# Altium schematic symbol library jlcpcb_2025_04_resistors_extended_2512.schlib: 2667 symbols (part 7 of 14) (continued)
## FRC2512F0000TS
designator R?  Resistance: 0Ω  (hidden comment: *)
Resistor, 0Ω, ±1%, 1W, 200V, -55℃~+155℃, SMD 2512; Manufacturer: Uniroyal; Manufacturer Part Number: FRC2512F0000TS; Supplier 1: LCSC; Supplier Part Number 1: C2934043; JLCPCB Part Number: C2934043; Power Rating: 1W; Category: Resistors; Package Size: 2512; JLCPCB Basic Part: Yes; Tolerance: ±1%; Voltage Rating: 200V; Temperature Rating: -55℃~+155℃; ComponentLink1Description: Datasheet; ComponentLink1URL: https://wmsc.lcsc.com/wmsc/upload/file/pdf/v2/lcsc/2308241947_FOJAN-FRC2512F0000TS_C2934043.pdf; ComponentLink2Description: JLCPCB Part URL; ComponentLink2URL: https://jlcpcb.com/partdetail/C2934043
pins: 1, 2
1 alternate drawing of the same symbol

## FRC2512F1R00TS
designator R?  Resistance: 1Ω  (hidden comment: *)
Resistor, 1Ω, ±1%, 1W, 200V, ±200ppm/℃, SMD 2512; Manufacturer: Uniroyal; Manufacturer Part Number: FRC2512F1R00TS; Supplier 1: LCSC; Supplier Part Number 1: C2999526; JLCPCB Part Number: C2999526; Power Rating: 1W; Category: Resistors; Package Size: 2512; JLCPCB Basic Part: Yes; Tolerance: ±1%; Voltage Rating: 200V; Temperature Coefficient: ±200ppm/℃; ComponentLink1Description: Datasheet; ComponentLink1URL: https://wmsc.lcsc.com/wmsc/upload/file/pdf/v2/lcsc/2308241947_FOJAN-FRC2512F1R00TS_C2999526.pdf; ComponentLink2Description: JLCPCB Part URL; ComponentLink2URL: https://jlcpcb.com/partdetail/C2999526
pins: 1, 2
1 alternate drawing of the same symbol

## FRC2512F1R10TS
designator R?  Resistance: 1.1Ω  (hidden comment: *)
Resistor, 1.1Ω, ±1%, 1W, 200V, ±200ppm/℃, -55℃~+155℃, SMD 2512; Manufacturer: Uniroyal; Manufacturer Part Number: FRC2512F1R10TS; Supplier 1: LCSC; Supplier Part Number 1: C2934053; JLCPCB Part Number: C2934053; Power Rating: 1W; Category: Resistors; Package Size: 2512; JLCPCB Basic Part: Yes; Tolerance: ±1%; Voltage Rating: 200V; Temperature Coefficient: ±200ppm/℃; Temperature Rating: -55℃~+155℃; ComponentLink1Description: Datasheet; ComponentLink1URL: https://wmsc.lcsc.com/wmsc/upload/file/pdf/v2/lcsc/2308241947_FOJAN-FRC2512F1R10TS_C2934053.pdf; ComponentLink2Description: JLCPCB Part URL; ComponentLink2URL: https://jlcpcb.com/partdetail/C2934053
pins: 1, 2
1 alternate drawing of the same symbol

## FRC2512F1R20TS
designator R?  Resistance: 1.2Ω  (hidden comment: *)
Resistor, 1.2Ω, ±1%, 1W, 200V, ±200ppm/℃, -55℃~+155℃, SMD 2512; Manufacturer: Uniroyal; Manufacturer Part Number: FRC2512F1R20TS; Supplier 1: LCSC; Supplier Part Number 1: C2960682; JLCPCB Part Number: C2960682; Power Rating: 1W; Category: Resistors; Package Size: 2512; JLCPCB Basic Part: Yes; Tolerance: ±1%; Voltage Rating: 200V; Temperature Coefficient: ±200ppm/℃; Temperature Rating: -55℃~+155℃; ComponentLink1Description: Datasheet; ComponentLink1URL: https://wmsc.lcsc.com/wmsc/upload/file/pdf/v2/lcsc/2308241947_FOJAN-FRC2512F1R20TS_C2960682.pdf; ComponentLink2Description: JLCPCB Part URL; ComponentLink2URL: https://jlcpcb.com/partdetail/C2960682
pins: 1, 2
1 alternate drawing of the same symbol

## FRC2512F1R50TS
designator R?  Resistance: 1.5Ω  (hidden comment: *)
Resistor, 1.5Ω, ±1%, 1W, 200V, ±200ppm/℃, -55℃~+155℃, SMD 2512; Manufacturer: Uniroyal; Manufacturer Part Number: FRC2512F1R50TS; Supplier 1: LCSC; Supplier Part Number 1: C2934054; JLCPCB Part Number: C2934054; Power Rating: 1W; Category: Resistors; Package Size: 2512; JLCPCB Basic Part: Yes; Tolerance: ±1%; Voltage Rating: 200V; Temperature Coefficient: ±200ppm/℃; Temperature Rating: -55℃~+155℃; ComponentLink1Description: Datasheet; ComponentLink1URL: https://wmsc.lcsc.com/wmsc/upload/file/pdf/v2/lcsc/2308241947_FOJAN-FRC2512F1R50TS_C2934054.pdf; ComponentLink2Description: JLCPCB Part URL; ComponentLink2URL: https://jlcpcb.com/partdetail/C2934054
pins: 1, 2
1 alternate drawing of the same symbol

## FRC2512F1R60TS
designator R?  Resistance: 1.6Ω  (hidden comment: *)
Resistor, 1.6Ω, ±1%, 1W, 200V, ±200ppm/℃, -55℃~+155℃, SMD 2512; Manufacturer: Uniroyal; Manufacturer Part Number: FRC2512F1R60TS; Supplier 1: LCSC; Supplier Part Number 1: C2934055; JLCPCB Part Number: C2934055; Power Rating: 1W; Category: Resistors; Package Size: 2512; JLCPCB Basic Part: Yes; Tolerance: ±1%; Voltage Rating: 200V; Temperature Coefficient: ±200ppm/℃; Temperature Rating: -55℃~+155℃; ComponentLink1Description: Datasheet; ComponentLink1URL: https://wmsc.lcsc.com/wmsc/upload/file/pdf/v2/lcsc/2308241947_FOJAN-FRC2512F1R60TS_C2934055.pdf; ComponentLink2Description: JLCPCB Part URL; ComponentLink2URL: https://jlcpcb.com/partdetail/C2934055
pins: 1, 2
1 alternate drawing of the same symbol

## FRC2512F1R80TS
designator R?  Resistance: 1.8Ω  (hidden comment: *)
Resistor, 1.8Ω, ±1%, 1W, 200V, ±200ppm/℃, -55℃~+155℃, SMD 2512; Manufacturer: Uniroyal; Manufacturer Part Number: FRC2512F1R80TS; Supplier 1: LCSC; Supplier Part Number 1: C2960771; JLCPCB Part Number: C2960771; Power Rating: 1W; Category: Resistors; Package Size: 2512; JLCPCB Basic Part: Yes; Tolerance: ±1%; Voltage Rating: 200V; Temperature Coefficient: ±200ppm/℃; Temperature Rating: -55℃~+155℃; ComponentLink1Description: Datasheet; ComponentLink1URL: https://wmsc.lcsc.com/wmsc/upload/file/pdf/v2/lcsc/2308241947_FOJAN-FRC2512F1R80TS_C2960771.pdf; ComponentLink2Description: JLCPCB Part URL; ComponentLink2URL: https://jlcpcb.com/partdetail/C2960771
pins: 1, 2
1 alternate drawing of the same symbol

## FRC2512F2R20TS
designator R?  Resistance: 2.2Ω  (hidden comment: *)
Resistor, 2.2Ω, ±1%, 1W, 200V, ±200ppm/℃, -55℃~+155℃, SMD 2512; Manufacturer: Uniroyal; Manufacturer Part Number: FRC2512F2R20TS; Supplier 1: LCSC; Supplier Part Number 1: C2934065; JLCPCB Part Number: C2934065; Power Rating: 1W; Category: Resistors; Package Size: 2512; JLCPCB Basic Part: Yes; Tolerance: ±1%; Voltage Rating: 200V; Temperature Coefficient: ±200ppm/℃; Temperature Rating: -55℃~+155℃; ComponentLink1Description: Datasheet; ComponentLink1URL: https://wmsc.lcsc.com/wmsc/upload/file/pdf/v2/lcsc/2202151130_FOJAN-FRC2512F2R20TS_C2934065.pdf; ComponentLink2Description: JLCPCB Part URL; ComponentLink2URL: https://jlcpcb.com/partdetail/C2934065
pins: 1, 2
1 alternate drawing of the same symbol

## FRC2512F2R40TS
designator R?  Resistance: 2.4Ω  (hidden comment: *)
Resistor, 2.4Ω, ±1%, 1W, 200V, ±200ppm/℃, -55℃~+155℃, SMD 2512; Manufacturer: Uniroyal; Manufacturer Part Number: FRC2512F2R40TS; Supplier 1: LCSC; Supplier Part Number 1: C2934066; JLCPCB Part Number: C2934066; Power Rating: 1W; Category: Resistors; Package Size: 2512; JLCPCB Basic Part: Yes; Tolerance: ±1%; Voltage Rating: 200V; Temperature Coefficient: ±200ppm/℃; Temperature Rating: -55℃~+155℃; ComponentLink1Description: Datasheet; ComponentLink1URL: https://wmsc.lcsc.com/wmsc/upload/file/pdf/v2/lcsc/2308241947_FOJAN-FRC2512F2R40TS_C2934066.pdf; ComponentLink2Description: JLCPCB Part URL; ComponentLink2URL: https://jlcpcb.com/partdetail/C2934066
pins: 1, 2
1 alternate drawing of the same symbol

## FRC2512F2R49TS
designator R?  Resistance: 2.49Ω  (hidden comment: *)
Resistor, 2.49Ω, ±1%, 1W, ±200ppm/℃, SMD 2512; Manufacturer: Uniroyal; Manufacturer Part Number: FRC2512F2R49TS; Supplier 1: LCSC; Supplier Part Number 1: C5126187; JLCPCB Part Number: C5126187; Power Rating: 1W; Category: Resistors; Package Size: 2512; JLCPCB Basic Part: Yes; Tolerance: ±1%; Temperature Coefficient: ±200ppm/℃; ComponentLink1Description: Datasheet; ComponentLink1URL: https://wmsc.lcsc.com/wmsc/upload/file/pdf/v2/lcsc/2308241947_FOJAN-FRC2512F2R49TS_C5126187.pdf; ComponentLink2Description: JLCPCB Part URL; ComponentLink2URL: https://jlcpcb.com/partdetail/C5126187
pins: 1, 2
1 alternate drawing of the same symbol

## FRC2512F2R70TS
designator R?  Resistance: 2.7Ω  (hidden comment: *)
Resistor, 2.7Ω, ±1%, 1W, 200V, ±200ppm/℃, SMD 2512; Manufacturer: Uniroyal; Manufacturer Part Number: FRC2512F2R70TS; Supplier 1: LCSC; Supplier Part Number 1: C2999529; JLCPCB Part Number: C2999529; Power Rating: 1W; Category: Resistors; Package Size: 2512; JLCPCB Basic Part: Yes; Tolerance: ±1%; Voltage Rating: 200V; Temperature Coefficient: ±200ppm/℃; ComponentLink1Description: Datasheet; ComponentLink1URL: https://wmsc.lcsc.com/wmsc/upload/file/pdf/v2/lcsc/2308241947_FOJAN-FRC2512F2R70TS_C2999529.pdf; ComponentLink2Description: JLCPCB Part URL; ComponentLink2URL: https://jlcpcb.com/partdetail/C2999529
pins: 1, 2
1 alternate drawing of the same symbol

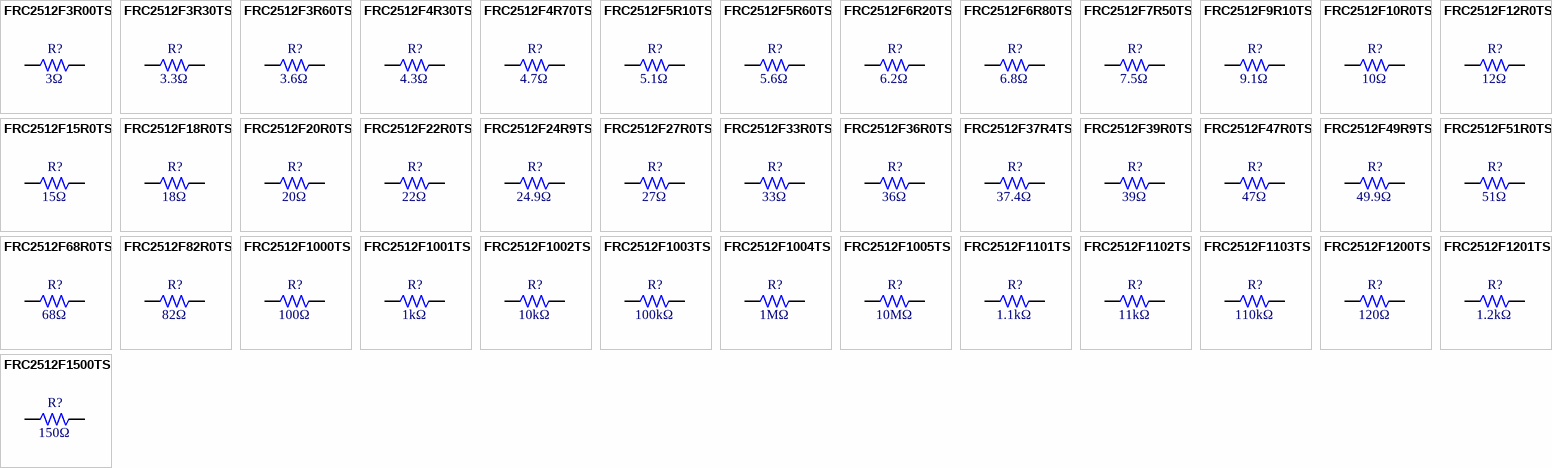
[diagram p31: symbols FRC2512F3R00TS to FRC2512F1500TS]

## FRC2512F3R00TS
designator R?  Resistance: 3Ω  (hidden comment: *)
Resistor, 3Ω, ±1%, 1W, 200V, ±200ppm/℃, SMD 2512; Manufacturer: Uniroyal; Manufacturer Part Number: FRC2512F3R00TS; Supplier 1: LCSC; Supplier Part Number 1: C2999603; JLCPCB Part Number: C2999603; Power Rating: 1W; Category: Resistors; Package Size: 2512; JLCPCB Basic Part: Yes; Tolerance: ±1%; Voltage Rating: 200V; Temperature Coefficient: ±200ppm/℃; ComponentLink1Description: Datasheet; ComponentLink1URL: https://wmsc.lcsc.com/wmsc/upload/file/pdf/v2/lcsc/2308241947_FOJAN-FRC2512F3R00TS_C2999603.pdf; ComponentLink2Description: JLCPCB Part URL; ComponentLink2URL: https://jlcpcb.com/partdetail/C2999603
pins: 1, 2
1 alternate drawing of the same symbol

## FRC2512F3R30TS
designator R?  Resistance: 3.3Ω  (hidden comment: *)
Resistor, 3.3Ω, ±1%, 1W, 200V, ±200ppm/℃, -55℃~+155℃, SMD 2512; Manufacturer: Uniroyal; Manufacturer Part Number: FRC2512F3R30TS; Supplier 1: LCSC; Supplier Part Number 1: C2960811; JLCPCB Part Number: C2960811; Power Rating: 1W; Category: Resistors; Package Size: 2512; JLCPCB Basic Part: Yes; Tolerance: ±1%; Voltage Rating: 200V; Temperature Coefficient: ±200ppm/℃; Temperature Rating: -55℃~+155℃; ComponentLink1Description: Datasheet; ComponentLink1URL: https://wmsc.lcsc.com/wmsc/upload/file/pdf/v2/lcsc/2308241947_FOJAN-FRC2512F3R30TS_C2960811.pdf; ComponentLink2Description: JLCPCB Part URL; ComponentLink2URL: https://jlcpcb.com/partdetail/C2960811
pins: 1, 2
1 alternate drawing of the same symbol

## FRC2512F3R60TS
designator R?  Resistance: 3.6Ω  (hidden comment: *)
Resistor, 3.6Ω, ±1%, 1W, 200V, ±200ppm/℃, -55℃~+155℃, SMD 2512; Manufacturer: Uniroyal; Manufacturer Part Number: FRC2512F3R60TS; Supplier 1: LCSC; Supplier Part Number 1: C2974111; JLCPCB Part Number: C2974111; Power Rating: 1W; Category: Resistors; Package Size: 2512; JLCPCB Basic Part: Yes; Tolerance: ±1%; Voltage Rating: 200V; Temperature Coefficient: ±200ppm/℃; Temperature Rating: -55℃~+155℃; ComponentLink1Description: Datasheet; ComponentLink1URL: https://wmsc.lcsc.com/wmsc/upload/file/pdf/v2/lcsc/2202151130_FOJAN-FRC2512F3R60TS_C2974111.pdf; ComponentLink2Description: JLCPCB Part URL; ComponentLink2URL: https://jlcpcb.com/partdetail/C2974111
pins: 1, 2
1 alternate drawing of the same symbol

## FRC2512F4R30TS
designator R?  Resistance: 4.3Ω  (hidden comment: *)
Resistor, 4.3Ω, ±1%, 1W, 200V, ±200ppm/℃, -55℃~+155℃, SMD 2512; Manufacturer: Uniroyal; Manufacturer Part Number: FRC2512F4R30TS; Supplier 1: LCSC; Supplier Part Number 1: C2960775; JLCPCB Part Number: C2960775; Power Rating: 1W; Category: Resistors; Package Size: 2512; JLCPCB Basic Part: Yes; Tolerance: ±1%; Voltage Rating: 200V; Temperature Coefficient: ±200ppm/℃; Temperature Rating: -55℃~+155℃; ComponentLink1Description: Datasheet; ComponentLink1URL: https://wmsc.lcsc.com/wmsc/upload/file/pdf/v2/lcsc/2308241947_FOJAN-FRC2512F4R30TS_C2960775.pdf; ComponentLink2Description: JLCPCB Part URL; ComponentLink2URL: https://jlcpcb.com/partdetail/C2960775
pins: 1, 2
1 alternate drawing of the same symbol

## FRC2512F4R70TS
designator R?  Resistance: 4.7Ω  (hidden comment: *)
Resistor, 4.7Ω, ±1%, 1W, 200V, ±200ppm/℃, SMD 2512; Manufacturer: Uniroyal; Manufacturer Part Number: FRC2512F4R70TS; Supplier 1: LCSC; Supplier Part Number 1: C2999606; JLCPCB Part Number: C2999606; Power Rating: 1W; Category: Resistors; Package Size: 2512; JLCPCB Basic Part: Yes; Tolerance: ±1%; Voltage Rating: 200V; Temperature Coefficient: ±200ppm/℃; ComponentLink1Description: Datasheet; ComponentLink1URL: https://wmsc.lcsc.com/wmsc/upload/file/pdf/v2/lcsc/2308241947_FOJAN-FRC2512F4R70TS_C2999606.pdf; ComponentLink2Description: JLCPCB Part URL; ComponentLink2URL: https://jlcpcb.com/partdetail/C2999606
pins: 1, 2
1 alternate drawing of the same symbol

## FRC2512F5R10TS
designator R?  Resistance: 5.1Ω  (hidden comment: *)
Resistor, 5.1Ω, ±1%, 1W, 200V, ±200ppm/℃, -55℃~+155℃, SMD 2512; Manufacturer: Uniroyal; Manufacturer Part Number: FRC2512F5R10TS; Supplier 1: LCSC; Supplier Part Number 1: C2934079; JLCPCB Part Number: C2934079; Power Rating: 1W; Category: Resistors; Package Size: 2512; JLCPCB Basic Part: Yes; Tolerance: ±1%; Voltage Rating: 200V; Temperature Coefficient: ±200ppm/℃; Temperature Rating: -55℃~+155℃; ComponentLink1Description: Datasheet; ComponentLink1URL: https://wmsc.lcsc.com/wmsc/upload/file/pdf/v2/lcsc/2308241947_FOJAN-FRC2512F5R10TS_C2934079.pdf; ComponentLink2Description: JLCPCB Part URL; ComponentLink2URL: https://jlcpcb.com/partdetail/C2934079
pins: 1, 2
1 alternate drawing of the same symbol

## FRC2512F5R60TS
designator R?  Resistance: 5.6Ω  (hidden comment: *)
Resistor, 5.6Ω, ±1%, 1W, 200V, ±200ppm/℃, SMD 2512; Manufacturer: Uniroyal; Manufacturer Part Number: FRC2512F5R60TS; Supplier 1: LCSC; Supplier Part Number 1: C2999604; JLCPCB Part Number: C2999604; Power Rating: 1W; Category: Resistors; Package Size: 2512; JLCPCB Basic Part: Yes; Tolerance: ±1%; Voltage Rating: 200V; Temperature Coefficient: ±200ppm/℃; ComponentLink1Description: Datasheet; ComponentLink1URL: https://wmsc.lcsc.com/wmsc/upload/file/pdf/v2/lcsc/2308241947_FOJAN-FRC2512F5R60TS_C2999604.pdf; ComponentLink2Description: JLCPCB Part URL; ComponentLink2URL: https://jlcpcb.com/partdetail/C2999604
pins: 1, 2
1 alternate drawing of the same symbol

## FRC2512F6R20TS
designator R?  Resistance: 6.2Ω  (hidden comment: *)
Resistor, 6.2Ω, ±1%, 1W, 200V, ±200ppm/℃, SMD 2512; Manufacturer: Uniroyal; Manufacturer Part Number: FRC2512F6R20TS; Supplier 1: LCSC; Supplier Part Number 1: C3000561; JLCPCB Part Number: C3000561; Power Rating: 1W; Category: Resistors; Package Size: 2512; JLCPCB Basic Part: Yes; Tolerance: ±1%; Voltage Rating: 200V; Temperature Coefficient: ±200ppm/℃; ComponentLink1Description: Datasheet; ComponentLink1URL: https://wmsc.lcsc.com/wmsc/upload/file/pdf/v2/lcsc/2308241947_FOJAN-FRC2512F6R20TS_C3000561.pdf; ComponentLink2Description: JLCPCB Part URL; ComponentLink2URL: https://jlcpcb.com/partdetail/C3000561
pins: 1, 2
1 alternate drawing of the same symbol

## FRC2512F6R80TS
designator R?  Resistance: 6.8Ω  (hidden comment: *)
Resistor, 6.8Ω, ±1%, 1W, 200V, ±200ppm/℃, SMD 2512; Manufacturer: Uniroyal; Manufacturer Part Number: FRC2512F6R80TS; Supplier 1: LCSC; Supplier Part Number 1: C5121567; JLCPCB Part Number: C5121567; Power Rating: 1W; Category: Resistors; Package Size: 2512; JLCPCB Basic Part: Yes; Tolerance: ±1%; Voltage Rating: 200V; Temperature Coefficient: ±200ppm/℃; ComponentLink1Description: Datasheet; ComponentLink1URL: https://wmsc.lcsc.com/wmsc/upload/file/pdf/v2/lcsc/2308241947_FOJAN-FRC2512F6R80TS_C5121567.pdf; ComponentLink2Description: JLCPCB Part URL; ComponentLink2URL: https://jlcpcb.com/partdetail/C5121567
pins: 1, 2
1 alternate drawing of the same symbol

## FRC2512F7R50TS
designator R?  Resistance: 7.5Ω  (hidden comment: *)
Resistor, 7.5Ω, ±1%, 1W, 200V, ±200ppm/℃, -55℃~+155℃, SMD 2512; Manufacturer: Uniroyal; Manufacturer Part Number: FRC2512F7R50TS; Supplier 1: LCSC; Supplier Part Number 1: C2960814; JLCPCB Part Number: C2960814; Power Rating: 1W; Category: Resistors; Package Size: 2512; JLCPCB Basic Part: Yes; Tolerance: ±1%; Voltage Rating: 200V; Temperature Coefficient: ±200ppm/℃; Temperature Rating: -55℃~+155℃; ComponentLink1Description: Datasheet; ComponentLink1URL: https://wmsc.lcsc.com/wmsc/upload/file/pdf/v2/lcsc/2308241947_FOJAN-FRC2512F7R50TS_C2960814.pdf; ComponentLink2Description: JLCPCB Part URL; ComponentLink2URL: https://jlcpcb.com/partdetail/C2960814
pins: 1, 2
1 alternate drawing of the same symbol

## FRC2512F9R10TS
designator R?  Resistance: 9.1Ω  (hidden comment: *)
Resistor, 9.1Ω, ±1%, 1W, 200V, ±200ppm/℃, SMD 2512; Manufacturer: Uniroyal; Manufacturer Part Number: FRC2512F9R10TS; Supplier 1: LCSC; Supplier Part Number 1: C2999542; JLCPCB Part Number: C2999542; Power Rating: 1W; Category: Resistors; Package Size: 2512; JLCPCB Basic Part: Yes; Tolerance: ±1%; Voltage Rating: 200V; Temperature Coefficient: ±200ppm/℃; ComponentLink1Description: Datasheet; ComponentLink1URL: https://wmsc.lcsc.com/wmsc/upload/file/pdf/v2/lcsc/2308241947_FOJAN-FRC2512F9R10TS_C2999542.pdf; ComponentLink2Description: JLCPCB Part URL; ComponentLink2URL: https://jlcpcb.com/partdetail/C2999542
pins: 1, 2
1 alternate drawing of the same symbol

## FRC2512F10R0TS
designator R?  Resistance: 10Ω  (hidden comment: *)
Resistor, 10Ω, ±1%, 1W, 200V, ±200ppm/℃, -55℃~+155℃, SMD 2512; Manufacturer: Uniroyal; Manufacturer Part Number: FRC2512F10R0TS; Supplier 1: LCSC; Supplier Part Number 1: C2934046; JLCPCB Part Number: C2934046; Power Rating: 1W; Category: Resistors; Package Size: 2512; JLCPCB Basic Part: Yes; Tolerance: ±1%; Voltage Rating: 200V; Temperature Coefficient: ±200ppm/℃; Temperature Rating: -55℃~+155℃; ComponentLink1Description: Datasheet; ComponentLink1URL: https://wmsc.lcsc.com/wmsc/upload/file/pdf/v2/lcsc/2308241947_FOJAN-FRC2512F10R0TS_C2934046.pdf; ComponentLink2Description: JLCPCB Part URL; ComponentLink2URL: https://jlcpcb.com/partdetail/C2934046
pins: 1, 2
1 alternate drawing of the same symbol

## FRC2512F12R0TS
designator R?  Resistance: 12Ω  (hidden comment: *)
Resistor, 12Ω, ±1%, 1W, 200V, ±100ppm/℃, -55℃~+155℃, SMD 2512; Manufacturer: Uniroyal; Manufacturer Part Number: FRC2512F12R0TS; Supplier 1: LCSC; Supplier Part Number 1: C2974108; JLCPCB Part Number: C2974108; Power Rating: 1W; Category: Resistors; Package Size: 2512; JLCPCB Basic Part: Yes; Tolerance: ±1%; Voltage Rating: 200V; Temperature Coefficient: ±100ppm/℃; Temperature Rating: -55℃~+155℃; ComponentLink1Description: Datasheet; ComponentLink1URL: https://wmsc.lcsc.com/wmsc/upload/file/pdf/v2/lcsc/2202151130_FOJAN-FRC2512F12R0TS_C2974108.pdf; ComponentLink2Description: JLCPCB Part URL; ComponentLink2URL: https://jlcpcb.com/partdetail/C2974108
pins: 1, 2
1 alternate drawing of the same symbol

## FRC2512F15R0TS
designator R?  Resistance: 15Ω  (hidden comment: *)
Resistor, 15Ω, ±1%, 1W, 200V, ±100ppm/℃, -55℃~+155℃, SMD 2512; Manufacturer: Uniroyal; Manufacturer Part Number: FRC2512F15R0TS; Supplier 1: LCSC; Supplier Part Number 1: C2934051; JLCPCB Part Number: C2934051; Power Rating: 1W; Category: Resistors; Package Size: 2512; JLCPCB Basic Part: Yes; Tolerance: ±1%; Voltage Rating: 200V; Temperature Coefficient: ±100ppm/℃; Temperature Rating: -55℃~+155℃; ComponentLink1Description: Datasheet; ComponentLink1URL: https://wmsc.lcsc.com/wmsc/upload/file/pdf/v2/lcsc/2308241947_FOJAN-FRC2512F15R0TS_C2934051.pdf; ComponentLink2Description: JLCPCB Part URL; ComponentLink2URL: https://jlcpcb.com/partdetail/C2934051
pins: 1, 2
1 alternate drawing of the same symbol

## FRC2512F18R0TS
designator R?  Resistance: 18Ω  (hidden comment: *)
Resistor, 18Ω, ±1%, 1W, 200V, ±100ppm/℃, -55℃~+155℃, SMD 2512; Manufacturer: Uniroyal; Manufacturer Part Number: FRC2512F18R0TS; Supplier 1: LCSC; Supplier Part Number 1: C2934052; JLCPCB Part Number: C2934052; Power Rating: 1W; Category: Resistors; Package Size: 2512; JLCPCB Basic Part: Yes; Tolerance: ±1%; Voltage Rating: 200V; Temperature Coefficient: ±100ppm/℃; Temperature Rating: -55℃~+155℃; ComponentLink1Description: Datasheet; ComponentLink1URL: https://wmsc.lcsc.com/wmsc/upload/file/pdf/v2/lcsc/2308241947_FOJAN-FRC2512F18R0TS_C2934052.pdf; ComponentLink2Description: JLCPCB Part URL; ComponentLink2URL: https://jlcpcb.com/partdetail/C2934052
pins: 1, 2
1 alternate drawing of the same symbol

## FRC2512F20R0TS
designator R?  Resistance: 20Ω  (hidden comment: *)
Resistor, 20Ω, ±1%, 1W, 200V, ±100ppm/℃, -55℃~+155℃, SMD 2512; Manufacturer: Uniroyal; Manufacturer Part Number: FRC2512F20R0TS; Supplier 1: LCSC; Supplier Part Number 1: C2960725; JLCPCB Part Number: C2960725; Power Rating: 1W; Category: Resistors; Package Size: 2512; JLCPCB Basic Part: Yes; Tolerance: ±1%; Voltage Rating: 200V; Temperature Coefficient: ±100ppm/℃; Temperature Rating: -55℃~+155℃; ComponentLink1Description: Datasheet; ComponentLink1URL: https://wmsc.lcsc.com/wmsc/upload/file/pdf/v2/lcsc/2308241947_FOJAN-FRC2512F20R0TS_C2960725.pdf; ComponentLink2Description: JLCPCB Part URL; ComponentLink2URL: https://jlcpcb.com/partdetail/C2960725
pins: 1, 2
1 alternate drawing of the same symbol

## FRC2512F22R0TS
designator R?  Resistance: 22Ω  (hidden comment: *)
Resistor, 22Ω, ±1%, 1W, 200V, ±100ppm/℃, SMD 2512; Manufacturer: Uniroyal; Manufacturer Part Number: FRC2512F22R0TS; Supplier 1: LCSC; Supplier Part Number 1: C2999530; JLCPCB Part Number: C2999530; Power Rating: 1W; Category: Resistors; Package Size: 2512; JLCPCB Basic Part: Yes; Tolerance: ±1%; Voltage Rating: 200V; Temperature Coefficient: ±100ppm/℃; ComponentLink1Description: Datasheet; ComponentLink1URL: https://wmsc.lcsc.com/wmsc/upload/file/pdf/v2/lcsc/2308241947_FOJAN-FRC2512F22R0TS_C2999530.pdf; ComponentLink2Description: JLCPCB Part URL; ComponentLink2URL: https://jlcpcb.com/partdetail/C2999530
pins: 1, 2
1 alternate drawing of the same symbol

## FRC2512F24R9TS
designator R?  Resistance: 24.9Ω  (hidden comment: *)
Resistor, 24.9Ω, ±1%, 1W, 200V, ±100ppm/℃, -55℃~+155℃, SMD 2512; Manufacturer: Uniroyal; Manufacturer Part Number: FRC2512F24R9TS; Supplier 1: LCSC; Supplier Part Number 1: C2934062; JLCPCB Part Number: C2934062; Power Rating: 1W; Category: Resistors; Package Size: 2512; JLCPCB Basic Part: Yes; Tolerance: ±1%; Voltage Rating: 200V; Temperature Coefficient: ±100ppm/℃; Temperature Rating: -55℃~+155℃; ComponentLink1Description: Datasheet; ComponentLink1URL: https://wmsc.lcsc.com/wmsc/upload/file/pdf/v2/lcsc/2308241947_FOJAN-FRC2512F24R9TS_C2934062.pdf; ComponentLink2Description: JLCPCB Part URL; ComponentLink2URL: https://jlcpcb.com/partdetail/C2934062
pins: 1, 2
1 alternate drawing of the same symbol

## FRC2512F27R0TS
designator R?  Resistance: 27Ω  (hidden comment: *)
Resistor, 27Ω, ±1%, 1W, 200V, ±100ppm/℃, -55℃~+155℃, SMD 2512; Manufacturer: Uniroyal; Manufacturer Part Number: FRC2512F27R0TS; Supplier 1: LCSC; Supplier Part Number 1: C2934064; JLCPCB Part Number: C2934064; Power Rating: 1W; Category: Resistors; Package Size: 2512; JLCPCB Basic Part: Yes; Tolerance: ±1%; Voltage Rating: 200V; Temperature Coefficient: ±100ppm/℃; Temperature Rating: -55℃~+155℃; ComponentLink1Description: Datasheet; ComponentLink1URL: https://wmsc.lcsc.com/wmsc/upload/file/pdf/v2/lcsc/2308241947_FOJAN-FRC2512F27R0TS_C2934064.pdf; ComponentLink2Description: JLCPCB Part URL; ComponentLink2URL: https://jlcpcb.com/partdetail/C2934064
pins: 1, 2
1 alternate drawing of the same symbol

## FRC2512F33R0TS
designator R?  Resistance: 33Ω  (hidden comment: *)
Resistor, 33Ω, ±1%, 1W, 200V, ±100ppm/℃, -55℃~+155℃, SMD 2512; Manufacturer: Uniroyal; Manufacturer Part Number: FRC2512F33R0TS; Supplier 1: LCSC; Supplier Part Number 1: C2934070; JLCPCB Part Number: C2934070; Power Rating: 1W; Category: Resistors; Package Size: 2512; JLCPCB Basic Part: Yes; Tolerance: ±1%; Voltage Rating: 200V; Temperature Coefficient: ±100ppm/℃; Temperature Rating: -55℃~+155℃; ComponentLink1Description: Datasheet; ComponentLink1URL: https://wmsc.lcsc.com/wmsc/upload/file/pdf/v2/lcsc/2308241947_FOJAN-FRC2512F33R0TS_C2934070.pdf; ComponentLink2Description: JLCPCB Part URL; ComponentLink2URL: https://jlcpcb.com/partdetail/C2934070
pins: 1, 2
1 alternate drawing of the same symbol

## FRC2512F36R0TS
designator R?  Resistance: 36Ω  (hidden comment: *)
Resistor, 36Ω, ±1%, 1W, 200V, ±100ppm/℃, SMD 2512; Manufacturer: Uniroyal; Manufacturer Part Number: FRC2512F36R0TS; Supplier 1: LCSC; Supplier Part Number 1: C3013322; JLCPCB Part Number: C3013322; Power Rating: 1W; Category: Resistors; Package Size: 2512; JLCPCB Basic Part: Yes; Tolerance: ±1%; Voltage Rating: 200V; Temperature Coefficient: ±100ppm/℃; ComponentLink1Description: Datasheet; ComponentLink1URL: https://wmsc.lcsc.com/wmsc/upload/file/pdf/v2/lcsc/2308241947_FOJAN-FRC2512F36R0TS_C3013322.pdf; ComponentLink2Description: JLCPCB Part URL; ComponentLink2URL: https://jlcpcb.com/partdetail/C3013322
pins: 1, 2
1 alternate drawing of the same symbol

## FRC2512F37R4TS
designator R?  Resistance: 37.4Ω  (hidden comment: *)
Resistor, 37.4Ω, ±1%, 1W, SMD 2512; Manufacturer: Uniroyal; Manufacturer Part Number: FRC2512F37R4TS; Supplier 1: LCSC; Supplier Part Number 1: C5126023; JLCPCB Part Number: C5126023; Power Rating: 1W; Category: Resistors; Package Size: 2512; JLCPCB Basic Part: Yes; Tolerance: ±1%; ComponentLink1Description: Datasheet; ComponentLink1URL: https://wmsc.lcsc.com/wmsc/upload/file/pdf/v2/lcsc/2308241947_FOJAN-FRC2512F37R4TS_C5126023.pdf; ComponentLink2Description: JLCPCB Part URL; ComponentLink2URL: https://jlcpcb.com/partdetail/C5126023
pins: 1, 2
1 alternate drawing of the same symbol

## FRC2512F39R0TS
designator R?  Resistance: 39Ω  (hidden comment: *)
Resistor, 39Ω, ±1%, 1W, 200V, ±100ppm/℃, -55℃~+155℃, SMD 2512; Manufacturer: Uniroyal; Manufacturer Part Number: FRC2512F39R0TS; Supplier 1: LCSC; Supplier Part Number 1: C2934073; JLCPCB Part Number: C2934073; Power Rating: 1W; Category: Resistors; Package Size: 2512; JLCPCB Basic Part: Yes; Tolerance: ±1%; Voltage Rating: 200V; Temperature Coefficient: ±100ppm/℃; Temperature Rating: -55℃~+155℃; ComponentLink1Description: Datasheet; ComponentLink1URL: https://wmsc.lcsc.com/wmsc/upload/file/pdf/v2/lcsc/2308241947_FOJAN-FRC2512F39R0TS_C2934073.pdf; ComponentLink2Description: JLCPCB Part URL; ComponentLink2URL: https://jlcpcb.com/partdetail/C2934073
pins: 1, 2
1 alternate drawing of the same symbol

## FRC2512F47R0TS
designator R?  Resistance: 47Ω  (hidden comment: *)
Resistor, 47Ω, ±1%, 1W, 200V, ±100ppm/℃, SMD 2512; Manufacturer: Uniroyal; Manufacturer Part Number: FRC2512F47R0TS; Supplier 1: LCSC; Supplier Part Number 1: C3000771; JLCPCB Part Number: C3000771; Power Rating: 1W; Category: Resistors; Package Size: 2512; JLCPCB Basic Part: Yes; Tolerance: ±1%; Voltage Rating: 200V; Temperature Coefficient: ±100ppm/℃; ComponentLink1Description: Datasheet; ComponentLink1URL: https://wmsc.lcsc.com/wmsc/upload/file/pdf/v2/lcsc/2308241947_FOJAN-FRC2512F47R0TS_C3000771.pdf; ComponentLink2Description: JLCPCB Part URL; ComponentLink2URL: https://jlcpcb.com/partdetail/C3000771
pins: 1, 2
1 alternate drawing of the same symbol

## FRC2512F49R9TS
designator R?  Resistance: 49.9Ω  (hidden comment: *)
Resistor, 49.9Ω, ±1%, 1W, 200V, ±100ppm/℃, -55℃~+155℃, SMD 2512; Manufacturer: Uniroyal; Manufacturer Part Number: FRC2512F49R9TS; Supplier 1: LCSC; Supplier Part Number 1: C2960769; JLCPCB Part Number: C2960769; Power Rating: 1W; Category: Resistors; Package Size: 2512; JLCPCB Basic Part: Yes; Tolerance: ±1%; Voltage Rating: 200V; Temperature Coefficient: ±100ppm/℃; Temperature Rating: -55℃~+155℃; ComponentLink1Description: Datasheet; ComponentLink1URL: https://wmsc.lcsc.com/wmsc/upload/file/pdf/v2/lcsc/2308241947_FOJAN-FRC2512F49R9TS_C2960769.pdf; ComponentLink2Description: JLCPCB Part URL; ComponentLink2URL: https://jlcpcb.com/partdetail/C2960769
pins: 1, 2
1 alternate drawing of the same symbol

## FRC2512F51R0TS
designator R?  Resistance: 51Ω  (hidden comment: *)
Resistor, 51Ω, ±1%, 1W, 200V, ±100ppm/℃, -55℃~+155℃, SMD 2512; Manufacturer: Uniroyal; Manufacturer Part Number: FRC2512F51R0TS; Supplier 1: LCSC; Supplier Part Number 1: C2934078; JLCPCB Part Number: C2934078; Power Rating: 1W; Category: Resistors; Package Size: 2512; JLCPCB Basic Part: Yes; Tolerance: ±1%; Voltage Rating: 200V; Temperature Coefficient: ±100ppm/℃; Temperature Rating: -55℃~+155℃; ComponentLink1Description: Datasheet; ComponentLink1URL: https://wmsc.lcsc.com/wmsc/upload/file/pdf/v2/lcsc/2308241947_FOJAN-FRC2512F51R0TS_C2934078.pdf; ComponentLink2Description: JLCPCB Part URL; ComponentLink2URL: https://jlcpcb.com/partdetail/C2934078
pins: 1, 2
1 alternate drawing of the same symbol

## FRC2512F68R0TS
designator R?  Resistance: 68Ω  (hidden comment: *)
Resistor, 68Ω, ±1%, SMD 2512; Manufacturer: Uniroyal; Manufacturer Part Number: FRC2512F68R0TS; Supplier 1: LCSC; Supplier Part Number 1: C2999608; JLCPCB Part Number: C2999608; Category: Resistors; Package Size: 2512; JLCPCB Basic Part: Yes; Tolerance: ±1%; ComponentLink1Description: Datasheet; ComponentLink1URL: https://wmsc.lcsc.com/wmsc/upload/file/pdf/v2/lcsc/2308241947_FOJAN-FRC2512F68R0TS_C2999608.pdf; ComponentLink2Description: JLCPCB Part URL; ComponentLink2URL: https://jlcpcb.com/partdetail/C2999608
pins: 1, 2
1 alternate drawing of the same symbol

## FRC2512F82R0TS
designator R?  Resistance: 82Ω  (hidden comment: *)
Resistor, 82Ω, ±1%, 1W, 200V, ±100ppm/℃, SMD 2512; Manufacturer: Uniroyal; Manufacturer Part Number: FRC2512F82R0TS; Supplier 1: LCSC; Supplier Part Number 1: C3000773; JLCPCB Part Number: C3000773; Power Rating: 1W; Category: Resistors; Package Size: 2512; JLCPCB Basic Part: Yes; Tolerance: ±1%; Voltage Rating: 200V; Temperature Coefficient: ±100ppm/℃; ComponentLink1Description: Datasheet; ComponentLink1URL: https://wmsc.lcsc.com/wmsc/upload/file/pdf/v2/lcsc/2308241947_FOJAN-FRC2512F82R0TS_C3000773.pdf; ComponentLink2Description: JLCPCB Part URL; ComponentLink2URL: https://jlcpcb.com/partdetail/C3000773
pins: 1, 2
1 alternate drawing of the same symbol

## FRC2512F1000TS
designator R?  Resistance: 100Ω  (hidden comment: *)
Resistor, 100Ω, ±1%, 1W, 200V, ±100ppm/℃, -55℃~+155℃, SMD 2512; Manufacturer: Uniroyal; Manufacturer Part Number: FRC2512F1000TS; Supplier 1: LCSC; Supplier Part Number 1: C2960868; JLCPCB Part Number: C2960868; Power Rating: 1W; Category: Resistors; Package Size: 2512; JLCPCB Basic Part: Yes; Tolerance: ±1%; Voltage Rating: 200V; Temperature Coefficient: ±100ppm/℃; Temperature Rating: -55℃~+155℃; ComponentLink1Description: Datasheet; ComponentLink1URL: https://wmsc.lcsc.com/wmsc/upload/file/pdf/v2/lcsc/2308241947_FOJAN-FRC2512F1000TS_C2960868.pdf; ComponentLink2Description: JLCPCB Part URL; ComponentLink2URL: https://jlcpcb.com/partdetail/C2960868
pins: 1, 2
1 alternate drawing of the same symbol

## FRC2512F1001TS
designator R?  Resistance: 1kΩ  (hidden comment: *)
Resistor, 1kΩ, ±1%, 1W, 200V, ±100ppm/℃, -55℃~+155℃, SMD 2512; Manufacturer: Uniroyal; Manufacturer Part Number: FRC2512F1001TS; Supplier 1: LCSC; Supplier Part Number 1: C2960683; JLCPCB Part Number: C2960683; Power Rating: 1W; Category: Resistors; Package Size: 2512; JLCPCB Basic Part: Yes; Tolerance: ±1%; Voltage Rating: 200V; Temperature Coefficient: ±100ppm/℃; Temperature Rating: -55℃~+155℃; ComponentLink1Description: Datasheet; ComponentLink1URL: https://wmsc.lcsc.com/wmsc/upload/file/pdf/v2/lcsc/2308241947_FOJAN-FRC2512F1001TS_C2960683.pdf; ComponentLink2Description: JLCPCB Part URL; ComponentLink2URL: https://jlcpcb.com/partdetail/C2960683
pins: 1, 2
1 alternate drawing of the same symbol

## FRC2512F1002TS
designator R?  Resistance: 10kΩ  (hidden comment: *)
Resistor, 10kΩ, ±1%, 1W, 200V, ±100ppm/℃, -55℃~+155℃, SMD 2512; Manufacturer: Uniroyal; Manufacturer Part Number: FRC2512F1002TS; Supplier 1: LCSC; Supplier Part Number 1: C2934044; JLCPCB Part Number: C2934044; Power Rating: 1W; Category: Resistors; Package Size: 2512; JLCPCB Basic Part: Yes; Tolerance: ±1%; Voltage Rating: 200V; Temperature Coefficient: ±100ppm/℃; Temperature Rating: -55℃~+155℃; ComponentLink1Description: Datasheet; ComponentLink1URL: https://wmsc.lcsc.com/wmsc/upload/file/pdf/v2/lcsc/2308241947_FOJAN-FRC2512F1002TS_C2934044.pdf; ComponentLink2Description: JLCPCB Part URL; ComponentLink2URL: https://jlcpcb.com/partdetail/C2934044
pins: 1, 2
1 alternate drawing of the same symbol

## FRC2512F1003TS
designator R?  Resistance: 100kΩ  (hidden comment: *)
Resistor, 100kΩ, ±1%, 1W, 200V, ±100ppm/℃, -55℃~+155℃, SMD 2512; Manufacturer: Uniroyal; Manufacturer Part Number: FRC2512F1003TS; Supplier 1: LCSC; Supplier Part Number 1: C2934045; JLCPCB Part Number: C2934045; Power Rating: 1W; Category: Resistors; Package Size: 2512; JLCPCB Basic Part: Yes; Tolerance: ±1%; Voltage Rating: 200V; Temperature Coefficient: ±100ppm/℃; Temperature Rating: -55℃~+155℃; ComponentLink1Description: Datasheet; ComponentLink1URL: https://wmsc.lcsc.com/wmsc/upload/file/pdf/v2/lcsc/2308241947_FOJAN-FRC2512F1003TS_C2934045.pdf; ComponentLink2Description: JLCPCB Part URL; ComponentLink2URL: https://jlcpcb.com/partdetail/C2934045
pins: 1, 2
1 alternate drawing of the same symbol

## FRC2512F1004TS
designator R?  Resistance: 1MΩ  (hidden comment: *)
Resistor, 1MΩ, ±1%, 1W, 200V, ±100ppm/℃, SMD 2512; Manufacturer: Uniroyal; Manufacturer Part Number: FRC2512F1004TS; Supplier 1: LCSC; Supplier Part Number 1: C3000673; JLCPCB Part Number: C3000673; Power Rating: 1W; Category: Resistors; Package Size: 2512; JLCPCB Basic Part: Yes; Tolerance: ±1%; Voltage Rating: 200V; Temperature Coefficient: ±100ppm/℃; ComponentLink1Description: Datasheet; ComponentLink1URL: https://wmsc.lcsc.com/wmsc/upload/file/pdf/v2/lcsc/2308241947_FOJAN-FRC2512F1004TS_C3000673.pdf; ComponentLink2Description: JLCPCB Part URL; ComponentLink2URL: https://jlcpcb.com/partdetail/C3000673
pins: 1, 2
1 alternate drawing of the same symbol

## FRC2512F1005TS
designator R?  Resistance: 10MΩ  (hidden comment: *)
Resistor, 10MΩ, ±1%, 1W, ±100ppm/℃, SMD 2512; Manufacturer: Uniroyal; Manufacturer Part Number: FRC2512F1005TS; Supplier 1: LCSC; Supplier Part Number 1: C7467443; JLCPCB Part Number: C7467443; Power Rating: 1W; Category: Resistors; Package Size: 2512; JLCPCB Basic Part: Yes; Tolerance: ±1%; Temperature Coefficient: ±100ppm/℃; ComponentLink1Description: Datasheet; ComponentLink1URL: https://wmsc.lcsc.com/wmsc/upload/file/pdf/v2/lcsc/2404021727_FOJAN-FRC2512F1005TS_C7467443.pdf; ComponentLink2Description: JLCPCB Part URL; ComponentLink2URL: https://jlcpcb.com/partdetail/C7467443
pins: 1, 2
1 alternate drawing of the same symbol

## FRC2512F1101TS
designator R?  Resistance: 1.1kΩ  (hidden comment: *)
Resistor, 1.1kΩ, ±1%, 1W, 200V, ±100ppm/℃, -55℃~+155℃, SMD 2512; Manufacturer: Uniroyal; Manufacturer Part Number: FRC2512F1101TS; Supplier 1: LCSC; Supplier Part Number 1: C2974106; JLCPCB Part Number: C2974106; Power Rating: 1W; Category: Resistors; Package Size: 2512; JLCPCB Basic Part: Yes; Tolerance: ±1%; Voltage Rating: 200V; Temperature Coefficient: ±100ppm/℃; Temperature Rating: -55℃~+155℃; ComponentLink1Description: Datasheet; ComponentLink1URL: https://wmsc.lcsc.com/wmsc/upload/file/pdf/v2/lcsc/2202151130_FOJAN-FRC2512F1101TS_C2974106.pdf; ComponentLink2Description: JLCPCB Part URL; ComponentLink2URL: https://jlcpcb.com/partdetail/C2974106
pins: 1, 2
1 alternate drawing of the same symbol

## FRC2512F1102TS
designator R?  Resistance: 11kΩ  (hidden comment: *)
Resistor, 11kΩ, ±1%, 1W, 200V, ±100ppm/℃, SMD 2512; Manufacturer: Uniroyal; Manufacturer Part Number: FRC2512F1102TS; Supplier 1: LCSC; Supplier Part Number 1: C3000598; JLCPCB Part Number: C3000598; Power Rating: 1W; Category: Resistors; Package Size: 2512; JLCPCB Basic Part: Yes; Tolerance: ±1%; Voltage Rating: 200V; Temperature Coefficient: ±100ppm/℃; ComponentLink1Description: Datasheet; ComponentLink1URL: https://wmsc.lcsc.com/wmsc/upload/file/pdf/v2/lcsc/2308241947_FOJAN-FRC2512F1102TS_C3000598.pdf; ComponentLink2Description: JLCPCB Part URL; ComponentLink2URL: https://jlcpcb.com/partdetail/C3000598
pins: 1, 2
1 alternate drawing of the same symbol

## FRC2512F1103TS
designator R?  Resistance: 110kΩ  (hidden comment: *)
Resistor, 110kΩ, ±1%, 1W, 200V, ±100ppm/℃, -55℃~+155℃, SMD 2512; Manufacturer: Uniroyal; Manufacturer Part Number: FRC2512F1103TS; Supplier 1: LCSC; Supplier Part Number 1: C2934047; JLCPCB Part Number: C2934047; Power Rating: 1W; Category: Resistors; Package Size: 2512; JLCPCB Basic Part: Yes; Tolerance: ±1%; Voltage Rating: 200V; Temperature Coefficient: ±100ppm/℃; Temperature Rating: -55℃~+155℃; ComponentLink1Description: Datasheet; ComponentLink1URL: https://wmsc.lcsc.com/wmsc/upload/file/pdf/v2/lcsc/2308241947_FOJAN-FRC2512F1103TS_C2934047.pdf; ComponentLink2Description: JLCPCB Part URL; ComponentLink2URL: https://jlcpcb.com/partdetail/C2934047
pins: 1, 2
1 alternate drawing of the same symbol

## FRC2512F1200TS
designator R?  Resistance: 120Ω  (hidden comment: *)
Resistor, 120Ω, ±1%, 1W, 200V, ±100ppm/℃, -55℃~+155℃, SMD 2512; Manufacturer: Uniroyal; Manufacturer Part Number: FRC2512F1200TS; Supplier 1: LCSC; Supplier Part Number 1: C2974107; JLCPCB Part Number: C2974107; Power Rating: 1W; Category: Resistors; Package Size: 2512; JLCPCB Basic Part: Yes; Tolerance: ±1%; Voltage Rating: 200V; Temperature Coefficient: ±100ppm/℃; Temperature Rating: -55℃~+155℃; ComponentLink1Description: Datasheet; ComponentLink1URL: https://wmsc.lcsc.com/wmsc/upload/file/pdf/v2/lcsc/2202151130_FOJAN-FRC2512F1200TS_C2974107.pdf; ComponentLink2Description: JLCPCB Part URL; ComponentLink2URL: https://jlcpcb.com/partdetail/C2974107
pins: 1, 2
1 alternate drawing of the same symbol

## FRC2512F1201TS
designator R?  Resistance: 1.2kΩ  (hidden comment: *)
Resistor, 1.2kΩ, ±1%, SMD 2512; Manufacturer: Uniroyal; Manufacturer Part Number: FRC2512F1201TS; Supplier 1: LCSC; Supplier Part Number 1: C2999600; JLCPCB Part Number: C2999600; Category: Resistors; Package Size: 2512; JLCPCB Basic Part: Yes; Tolerance: ±1%; ComponentLink1Description: Datasheet; ComponentLink1URL: https://wmsc.lcsc.com/wmsc/upload/file/pdf/v2/lcsc/2308241947_FOJAN-FRC2512F1201TS_C2999600.pdf; ComponentLink2Description: JLCPCB Part URL; ComponentLink2URL: https://jlcpcb.com/partdetail/C2999600
pins: 1, 2
1 alternate drawing of the same symbol

## FRC2512F1500TS
designator R?  Resistance: 150Ω  (hidden comment: *)
Resistor, 150Ω, ±1%, 1W, 200V, ±100ppm/℃, SMD 2512; Manufacturer: Uniroyal; Manufacturer Part Number: FRC2512F1500TS; Supplier 1: LCSC; Supplier Part Number 1: C2934049; JLCPCB Part Number: C2934049; Power Rating: 1W; Category: Resistors; Package Size: 2512; JLCPCB Basic Part: Yes; Tolerance: ±1%; Voltage Rating: 200V; Temperature Coefficient: ±100ppm/℃; ComponentLink1Description: Datasheet; ComponentLink1URL: https://wmsc.lcsc.com/wmsc/upload/file/pdf/v2/lcsc/2308241947_FOJAN-FRC2512F1500TS_C2934049.pdf; ComponentLink2Description: JLCPCB Part URL; ComponentLink2URL: https://jlcpcb.com/partdetail/C2934049
pins: 1, 2
1 alternate drawing of the same symbol
